# Altium footprint library std-smt.PcbLib: 117 footprints (part 6 of 8)
Each footprint in its own frame and in the unit in brackets; x right, y up, seen from the top. Pads: shape width x height; smd on the part's side, far side on the other; paste and mask are expansions set on the pad; w line width, h text height; cw(c..) or ccw(c..) is an arc to the next point about the centre after c.
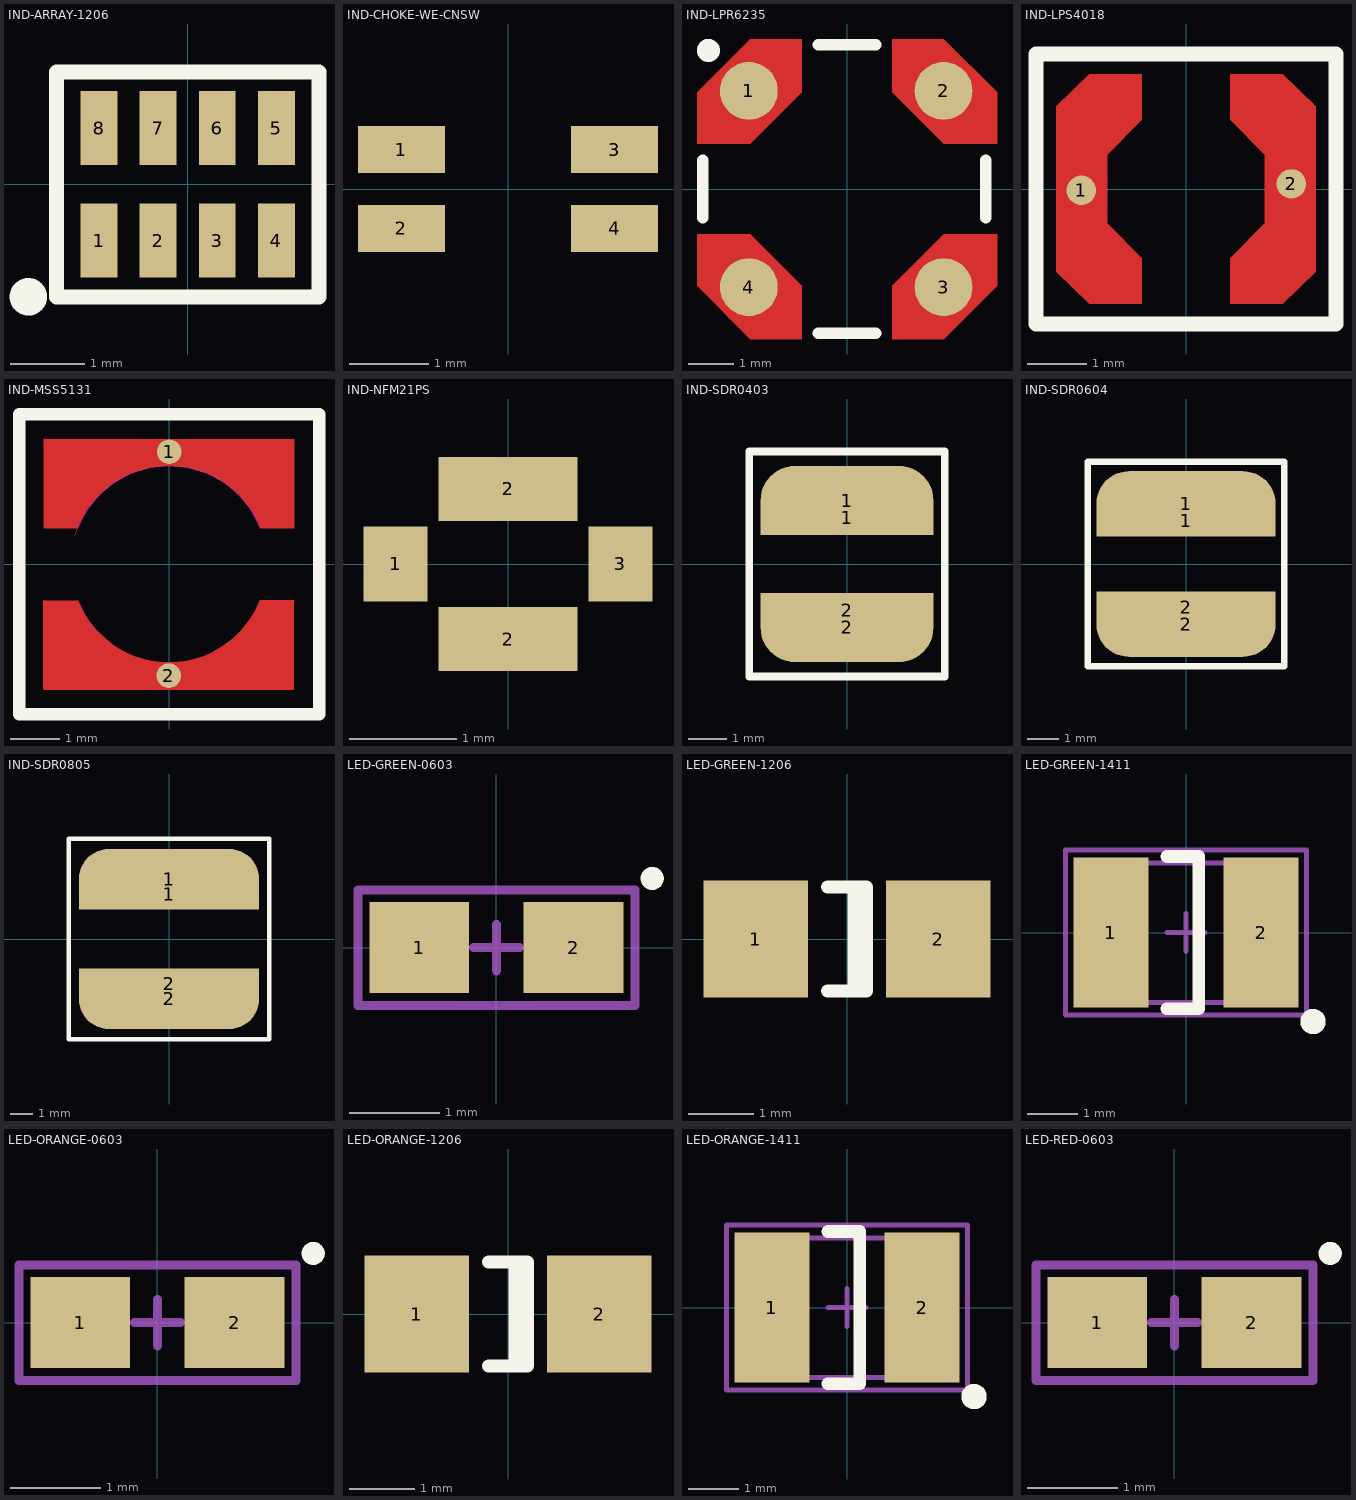
[diagram p5: the footprints below, top view; thin cyan lines are the x and y axes]

## IND-ARRAY-1206 [mm] "Chip Ferrite Bead Array, 1206"
height 0.6
pads (8):
  rect 0.5x1 smd: 1(-1.2,-0.762) 2(-0.4,-0.762) 3(0.4,-0.762) 4(1.2,-0.762) 5(1.2,0.762) 6(0.4,0.762) 7(-0.4,0.762) 8(-1.2,0.762)
Top Overlay:
  circle w0.254: c-2.159,-1.524 r0.127
  lines w0.203: -1.778,-1.524 1.778,-1.524 1.778,1.524 -1.778,1.524 -1.778,-1.524
3D body: height 0.8, standoff 0, extent -1.599,-0.803 1.601,0.797

## IND-CHOKE-WE-CNSW [mm] "WE-CNSW SMD Common Mode Line Filter"
height 1.6
pads (4):
  rect 1.1x0.6 smd: 1(-1.35,0.5) 2(-1.35,-0.5) 3(1.35,0.5) 4(1.35,-0.5)
3D body: height 1.9, standoff 0, extent -1.6,-0.8 1.6,0.8

## IND-LPR6235 [mil] "Coilcraft LPR6235 Step Up Flyback Transformer"
height 157.48
pads (4):
  round 50 smd: 1(-85,85) 2(83.66,85) 3(83.66,-85) 4(-85,-85)
Top Layer:
  region: -83.66,129.92 -39.37,129.92 -39.37,83.66 -83.66,39.37 -129.92,39.37 -129.92,83.66
  region: -129.92,-83.66 -129.92,-39.37 -83.66,-39.37 -39.37,-83.66 -39.37,-129.92 -83.66,-129.92
  region: 83.66,-129.92 39.37,-129.92 39.37,-83.66 83.66,-39.37 129.92,-39.37 129.92,-83.66
  region: 129.92,83.66 129.92,39.37 83.66,39.37 39.37,83.66 39.37,129.92 83.66,129.92
Top Overlay:
  circle w10: c-120,120 r5
  lines w10: -125,-25 -125,25 ; -25,-125 25,-125 ; -25,125 25,125 ; 120,-25 120,25
3D body: height 140.75, standoff 0, extent -119.1,-119.58 120.08,119.59

## IND-LPS4018 [mm] "Coilcraft LPS4018 shielded inductor"
height 4
pads (2):
  round 0.5 smd paste+0 mask+0: 1(-1.772,-0.023) 2(1.783,0.086)
Top Layer:
  region: -0.75,1.94 -1.64,1.94 -2.2,1.4 -2.2,-1.4 -1.64,-1.94 -0.75,-1.94 -0.75,-1.17 -1.33,-0.58 -1.33,0.58 -0.75,1.17
  region: 1.64,1.94 0.75,1.94 0.75,1.17 1.33,0.58 1.33,-0.58 0.75,-1.17 0.75,-1.94 1.64,-1.94 2.2,-1.4 2.2,1.4
Top Overlay:
  lines w0.254: -2.54,-2.286 -2.54,2.286 2.54,2.286 2.54,-2.286 -2.54,-2.286
3D body: height 1.8, standoff 0, extent -2.053,-2.053 2.053,2.053

## IND-MSS5131 [mm] "Coilcraft MSS5131 power inductor"
height 4
pads (2):
  round 0.5 smd paste+0 mask+0: 1(0.003,2.282) 2(-0.004,-2.267)
Top Layer:
  region: -2.54,0.74 -2.54,2.54 2.54,2.54 2.54,0.741 2.54,0.742 2.54,0.741 2.539,0.74 2.539,0.741 2.539,0.74 1.855,0.741 1.855,0.74 1.855,0.741 1.817,0.835 1.673,1.106 1.423,1.41 1.118,1.66 0.771,1.846 0.394,1.96 0.002,1.999 -0.39,1.96 -0.767,1.846 -1.114,1.66 -1.419,1.41 -1.669,1.106 -1.813,0.835 -1.851,0.74 -1.913,0.575 -1.823,0.815 -1.851,0.74 -1.852,0.74 -1.851,0.74 -1.852,0.74
  region: -2.541,-2.54 -2.54,-0.74 -2.541,-0.74 -2.54,-0.74 -2.537,-0.743 -1.856,-0.743 -1.857,-0.743 -1.856,-0.743 -1.818,-0.84 -1.671,-1.116 -1.421,-1.421 -1.116,-1.671 -0.769,-1.856 -0.392,-1.971 0,-2.009 0.392,-1.971 0.769,-1.856 1.116,-1.671 1.421,-1.421 1.671,-1.116 1.819,-0.836 1.858,-0.738 1.859,-0.738 1.858,-0.738 1.859,-0.738 1.86,-0.74 2.541,-0.74 2.54,-0.74 2.541,-0.74 2.54,-0.741 2.539,-2.54 2.54,-2.54 2.539,-2.54 -2.54,-2.54
  lines w0: -1.852,0.74 -2.54,0.74 -2.54,2.54 2.54,2.54 2.54,0.742 2.539,0.741 1.855,0.741 ; -2.54,-2.54 -2.54,-0.74 -2.537,-0.743 -1.857,-0.743 ccw(c0,0) 1.859,-0.738 1.86,-0.74 2.54,-0.74 2.539,-0.741 2.539,-2.54 ; -2.54,-2.54 -2.54,-2.54 ; -2.54,-2.54 2.539,-2.54 ; 2.539,-2.54 2.539,-2.54
Top Layer keep-out:
  lines w0: -1.852,0.74 cw(c0.002,-0.011) 1.855,0.741
Top Overlay:
  lines w0.254: -3.048,-3.048 3.048,-3.048 3.048,3.048 -3.048,3.048 -3.048,-3.048
3D body: height 3.1, standoff 0, extent -2.695,-2.684 2.702,2.699

## IND-NFM21PS [mm] "Filter, high frequency, NFM21PS"
height 1
pads (4):
  rect 0.6x0.7 smd: 1(-1.05,0) 3(1.05,0)
  rect 1.3x0.6 smd: 2(0,-0.7) 2(0,0.7)
3D body: height 0.85, standoff 0, extent -1,-0.625 1,0.625

## IND-SDR0403 [mm] "Inductor, surface mount, 4.5mm x 4.0mm x 3.2mm"
height 3.2
pads (4):
  rect 4.5x0.9 smd: 1(0,1.2) 2(0,-1.2)
  oval 4.5x1.8 smd: 1(0,1.65) 2(0,-1.65)
Top Overlay:
  lines w0.203: -2.54,-2.921 -2.54,2.921 2.54,2.921 2.54,-2.921 -2.54,-2.921
3D body: height 3.25, standoff 0, extent -2,-2.201 2,2.201

## IND-SDR0604 [mm] "Inductor, surface mount, 5.8mm x 5.8mm x 4.8mm"
height 4.8
pads (4):
  rect 5.8x1 smd: 1(0,1.397) 2(0,-1.397)
  oval 5.8x2.1 smd: 1(0,1.95) 2(0,-1.95)
Top Overlay:
  lines w0.203: -3.175,-3.302 3.175,-3.302 3.175,3.302 -3.175,3.302 -3.175,-3.302
3D body: height 4.55, standoff 0, extent -2.8,-2.754 2.8,2.754

## IND-SDR0805 [mm] "Inductor, surface mount, 7.8mm x 7.8mm x 5.3mm"
height 5.3
pads (4):
  rect 8x1.35 smd: 1(0,1.975) 2(0,-1.975)
  oval 8x2.7 smd: 1(0,2.65) 2(0,-2.65)
Top Overlay:
  lines w0.203: -4.445,-4.445 -4.445,4.445 4.445,4.445 4.445,-4.445 -4.445,-4.445
3D body: height 5.05, standoff 0, extent -3.75,-3.677 3.75,3.677

## LED-GREEN-0603 [mm] "SMD LED, Green, 0603"
height 1.143
pads (2):
  rect 1.1x1 smd: 1(-0.85,0) 2(0.85,0)
Top Overlay:
  circle w0.127: c1.714,0.762 r0.064
Mechanical 15:
  lines w0.1: -0.254,0 0.254,0 ; 0,-0.254 0,0.254 ; -1.524,-0.635 1.524,-0.635 1.524,0.635 -1.524,0.635 -1.524,-0.635
3D body: height 1.1, standoff 0, extent -0.81,-0.4 0.81,0.4

## LED-GREEN-1206 [mm] "SMD LED, green, 1206"
height 1.35
pads (2):
  rect 1.6x1.8 smd: 1(-1.4,0) 2(1.4,0)
Top Overlay:
  lines w0.2: -0.3,-0.8 0.3,-0.8 0.3,0.8 -0.3,0.8 ; 0.11,-0.8 0.11,0.8
3D body: height 1.11, standoff -0.4, extent -1.6,-0.787 1.6,0.813

## LED-GREEN-1411 [mm] "Led, Green, 2.8 mm x 3.5 mm body, SMD"
height 1.9
pads (2):
  rect 1.5x3 smd: 1(-1.5,0) 2(1.5,0)
Top Overlay:
  circle w0.254: c2.54,-1.778 r0.127
  lines w0.254: -0.381,-1.524 0.254,-1.524 0.254,1.524 -0.381,1.524
Mechanical 13:
  lines w0.1: -1.778,-1.397 -1.778,1.397 1.778,1.397 1.778,-1.397 -1.778,-1.397
Mechanical 15:
  lines w0.1: -0.381,0 0.381,0 ; 0,-0.381 0,0.381 ; -2.413,-1.651 2.413,-1.651 2.413,1.651 -2.413,1.651 -2.413,-1.651
3D body: height 1.1, standoff 0.6, extent -1.19,-1.198 1.2,1.198
3D body: height 1.75, standoff -0.06, extent -1.75,-1.4 1.75,1.4

## LED-ORANGE-0603 [mm] "SMD LED, Orange, 0603"
height 1.143
pads (2):
  rect 1.1x1 smd: 1(-0.85,0) 2(0.85,0)
Top Overlay:
  circle w0.127: c1.714,0.762 r0.064
Mechanical 15:
  lines w0.1: -0.254,0 0.254,0 ; 0,-0.254 0,0.254 ; -1.524,-0.635 -1.524,0.635 1.524,0.635 1.524,-0.635 -1.524,-0.635
3D body: height 1.1, standoff 0, extent -0.81,-0.4 0.81,0.4

## LED-ORANGE-1206 [mm] "SMD LED, orange, 1206"
height 1.35
pads (2):
  rect 1.6x1.8 smd: 1(-1.4,0) 2(1.4,0)
Top Overlay:
  lines w0.2: -0.3,-0.8 0.3,-0.8 0.3,0.8 -0.3,0.8 ; 0.11,-0.8 0.11,0.8
3D body: height 1.11, standoff -0.4, extent -1.6,-0.787 1.6,0.813

## LED-ORANGE-1411 [mm] "Led, Orange, 2.8 mm x 3.5 mm body, SMD"
height 1.9
pads (2):
  rect 1.5x3 smd: 1(-1.5,0) 2(1.5,0)
Top Overlay:
  circle w0.254: c2.54,-1.778 r0.127
  lines w0.254: -0.381,-1.524 0.254,-1.524 0.254,1.524 -0.381,1.524
Mechanical 13:
  lines w0.1: -1.778,-1.397 1.778,-1.397 1.778,1.397 -1.778,1.397 -1.778,-1.397
Mechanical 15:
  lines w0.1: -0.381,0 0.381,0 ; 0,-0.381 0,0.381 ; -2.413,-1.651 -2.413,1.651 2.413,1.651 2.413,-1.651 -2.413,-1.651
3D body: height 1.75, standoff -0.06, extent -1.75,-1.4 1.75,1.4
3D body: height 1.1, standoff 0.6, extent -1.19,-1.198 1.2,1.198

## LED-RED-0603 [mm] "SMD LED, Red, 0603"
height 1.143
pads (2):
  rect 1.1x1 smd: 1(-0.85,0) 2(0.85,0)
Top Overlay:
  circle w0.127: c1.714,0.762 r0.064
Mechanical 15:
  lines w0.1: -0.254,0 0.254,0 ; 0,-0.254 0,0.254 ; -1.524,-0.635 1.524,-0.635 1.524,0.635 -1.524,0.635 -1.524,-0.635
3D body: height 1.1, standoff 0, extent -0.81,-0.4 0.81,0.4